# Altium footprint library ACTION_IC.PcbLib: 137 footprints (part 8 of 9)
Each footprint in its own frame and in the unit in brackets; x right, y up, seen from the top. Pads: shape width x height; smd on the part's side, far side on the other; paste and mask are expansions set on the pad; w line width, h text height; cw(c..) or ccw(c..) is an arc to the next point about the centre after c.
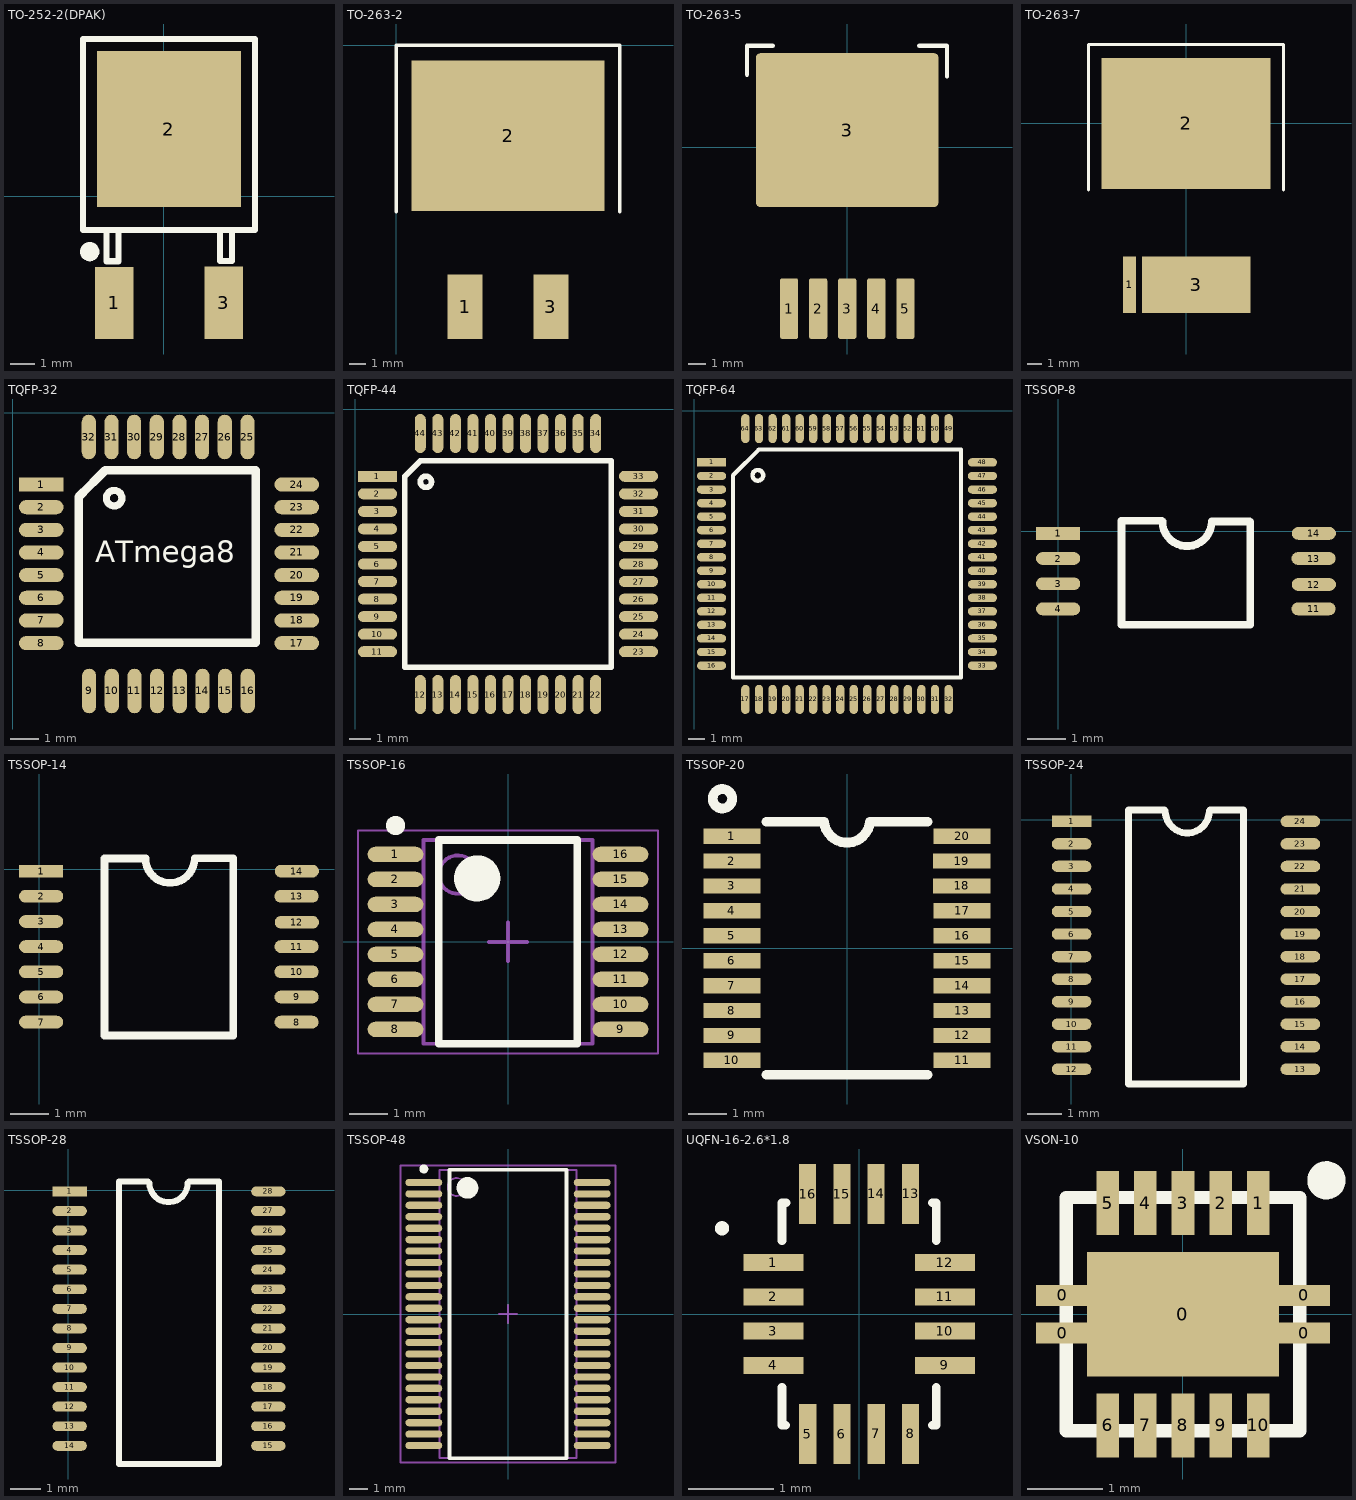
[diagram p7: the footprints below, top view; thin cyan lines are the x and y axes]

## TO-252-2(DPAK) [mil]
pads (3):
  rect 63x118.1 smd: 1(-81.63,-174.95)
  rect 236.2x255.9 smd: 2(8.33,109.85)
  rect 63x118.2 smd: 3(98.29,-174.7)
Top Overlay:
  lines w10: -94.03,-55.46 -94.03,-106.64 -74.35,-106.64 -74.35,-55.46 ; 91.89,-55.3 91.89,-106.48 111.58,-106.48 111.58,-55.3 ; -132.34,-55.46 -132.34,257.53 149,257.53 149,-55.46 -132.34,-55.46
  lines w15.75: -113.67,-91 cw(c-121.54,-90.95) -113.67,-90.9
3D body "TO-252.STEP": height 96.16, standoff 1.08, extent -121.74,-180.77 135.74,210.5

## TO-263-2 [mil]
pads (3):
  rect 82x150 smd: 1(160,-608) 3(360,-608)
  rect 450x350 smd: 2(260,-210)
Top Overlay:
  lines w8: 0,-387 0,0 520,0 520,-387.01
3D body "SW3dPS-DPAK.STEP": height 193.9, standoff -3.66, extent 61,-655.71 461,-54.78

## TO-263-5 [mil]
pads (6):
  rrect25% 42x140 smd: 1(-134,-372) 2(-67,-372) 3(0,-372) 4(67,-372) 5(134,-372)
  rrect5% 420x354.33 smd: 3(0,39.37)
Top Overlay:
  lines w10: -231,167 -231,234 -172,234 ; 166,234 229,234 ; 230,163 230,233
3D body "TO263-5.STEP": height 196.17, standoff 7.19, extent -196.85,-424.47 196.85,192.46

## TO-263-7 [mm]
pads (3):
  rect 0.9x3.81 smd: 1(-3.825,-10.922)
  rect 11.43x8.89 smd: 2(0,0)
  rect 7.35x3.81 smd: 3(0.695,-10.922)
Top Overlay:
  lines w0.203: -6.604,-4.496 -6.604,5.334 6.604,5.334 6.604,-4.496
3D body "User Library-TO263-7S.STEP": height 4.93, standoff 0.13, extent -4.975,-11.95 5.025,3.721

## TQFP-32 [mil]
pads (32):
  rect 62x19.68 smd: 1(40,-100)
  oval 62x19.68 smd: 2(40,-131.5) 3(40,-162.99) 4(40,-194.49) 5(40,-225.98) 6(40,-257.48) 7(40,-288.98) 8(40,-320.47) 17(395,-320.47) 18(395,-288.98) 19(395,-257.48) 20(395,-225.98) 21(395,-194.49) 22(395,-162.99) 23(395,-131.5) 24(395,-100)
  oval 19.68x62 smd: 9(106.51,-387) 10(138.01,-387) 11(169.5,-387) 12(201,-387) 13(232.5,-387) 14(263.99,-387) 15(295.49,-387) 16(326.98,-387) 25(326.52,-33.95) 26(295.02,-33.95) 27(263.53,-33.95) 28(232.03,-33.95) 29(200.53,-33.95) 30(169.04,-33.95) 31(137.54,-33.95) 32(106.05,-33.95)
Top Overlay:
  circle w10: c141.23,-119 r10.77
  lines w12: 93,-116 129,-80 338,-80 338,-320 92,-320 92,-117 98.99,-110.01
  text "ATmega8" at 115,-208 h30
3D body "IC_Microchip_ATMEGA328PB-AN_eec.STEP": height 10, standoff 0, extent 14,-412.18 418.36,-7.82

## TQFP-44 [mil]
pads (44):
  rect 70x19.68 smd: 1(40,-120)
  oval 70x19.68 smd: 2(40,-151.5) 3(40,-182.99) 4(40,-214.49) 5(40,-245.98) 6(40,-277.48) 7(40,-308.98) 8(40,-340.47) 9(40,-371.97) 10(40,-403.46) 11(40,-434.96) 23(508.5,-434.96) 24(508.5,-403.46) 25(508.5,-371.97) 26(508.5,-340.47) 27(508.5,-308.98) 28(508.5,-277.48) 29(508.5,-245.98) 30(508.5,-214.49) 31(508.5,-182.99) 32(508.5,-151.5) 33(508.5,-120)
  oval 19.68x70 smd: 12(116.77,-511.73) 13(148.27,-511.73) 14(179.76,-511.73) 15(211.26,-511.73) 16(242.76,-511.73) 17(274.25,-511.73) 18(305.75,-511.73) 19(337.24,-511.73) 20(368.74,-511.73) 21(400.24,-511.73) 22(431.73,-511.73) 34(431.73,-43.23) 35(400.24,-43.23) 36(368.74,-43.23) 37(337.24,-43.23) 38(305.75,-43.23) 39(274.25,-43.23) 40(242.76,-43.23) 41(211.26,-43.23) 42(179.76,-43.23) 43(148.27,-43.23) 44(116.77,-43.23)
Top Overlay:
  circle w10: c126.95,-130 r10.05
  lines w9.84: 89.21,-462.52 459.29,-462.52 459.29,-92.44
  lines w10: 89.21,-462.52 89.21,-120 116.77,-92.44 459.29,-92.44
3D body "TQFP-44.STEP": height 42.69, standoff -1.02, extent 39.79,-515.21 512.23,-42.77

## TQFP-64 [mm]
pads (64):
  rect 1.724x0.5 smd: 1(1.016,-3.044)
  oval 1.724x0.5 smd: 2(1.016,-3.844) 3(1.016,-4.644) 4(1.016,-5.444) 5(1.016,-6.244) 6(1.016,-7.044) 7(1.016,-7.844) 8(1.016,-8.644) 9(1.016,-9.444) 10(1.016,-10.244) 11(1.016,-11.044) 12(1.016,-11.844) 13(1.016,-12.644) 14(1.016,-13.444) 15(1.016,-14.244) 16(1.016,-15.044) 33(17.016,-15.044) 34(17.016,-14.244) 35(17.016,-13.444) 36(17.016,-12.644) 37(17.016,-11.844) 38(17.016,-11.044) 39(17.016,-10.244) 40(17.016,-9.444) 41(17.016,-8.644) 42(17.016,-7.844) 43(17.016,-7.044) 44(17.016,-6.244) 45(17.016,-5.444) 46(17.016,-4.644) 47(17.016,-3.844) 48(17.016,-3.044)
  oval 0.5x1.724 smd: 17(3.016,-17.044) 18(3.816,-17.044) 19(4.616,-17.044) 20(5.416,-17.044) 21(6.216,-17.044) 22(7.016,-17.044) 23(7.816,-17.044) 24(8.616,-17.044) 25(9.416,-17.044) 26(10.216,-17.044) 27(11.016,-17.044) 28(11.816,-17.044) 29(12.616,-17.044) 30(13.416,-17.044) 31(14.216,-17.044) 32(15.016,-17.044) 49(15.016,-1.044) 50(14.216,-1.044) 51(13.416,-1.044) 52(12.616,-1.044) 53(11.816,-1.044) 54(11.016,-1.044) 55(10.216,-1.044) 56(9.416,-1.044) 57(8.616,-1.044) 58(7.816,-1.044) 59(7.016,-1.044) 60(6.216,-1.044) 61(5.416,-1.044) 62(4.616,-1.044) 63(3.816,-1.044) 64(3.016,-1.044)
Top Overlay:
  circle w0.254: c3.748,-3.806 r0.316
  lines w0.254: 2.286,-15.744 2.286,-3.806 3.81,-2.282 15.748,-2.282 15.748,-15.744 2.286,-15.744
3D body "User Library-TQFP64-1.STEP": height 1.36, standoff 0, extent 0.893,-17.12 17.141,-0.871

## TSSOP-8 [mil]
pads (8):
  rect 45x12.99 smd: 1(-0.16,-2)
  oval 45x12.99 smd: 2(-0.16,-27.59) 3(-0.16,-53.18) 4(-0.16,-78.77) 11(259.69,-78.77) 12(260,-54) 13(259.69,-27.59) 14(260,-2)
Top Overlay:
  lines w7.87: 105.2,10.79 64.21,10.79 64.21,-94.88 195.31,-94.88 195.31,9.84 ; 106,10 ccw(c131,10) 156,10 194.52,10
3D body "TSS0P-8.STEP": height 43, standoff 0, extent 7.38,-99 254.62,19.11

## TSSOP-14 [mil]
pads (14):
  rect 45x12.99 smd: 1(1.84,-2)
  oval 45x12.99 smd: 2(1.84,-27.59) 3(1.84,-53.18) 4(1.84,-78.77) 5(1.84,-104.36) 6(1.84,-129.95) 7(1.84,-155.54) 8(261.69,-155.54) 9(261.69,-129.95) 10(261.69,-104.36) 11(261.69,-78.77) 12(262,-54) 13(261.69,-27.59) 14(262,-2)
Top Overlay:
  lines w7.87: 107.64,10.79 66.21,10.79 66.21,-169.29 197.31,-169.29 197.31,10.79 ; 108,11 ccw(c133,11) 158,11 197.11,11
3D body "User Library-TSSOP-14.STEP": height 47.24, standoff 0, extent 7.03,-177.43 258.99,19.43

## TSSOP-16 [mm]
height 1.1
pads (16):
  oval 1.45x0.4 smd: 1(-2.925,2.275) 2(-2.925,1.625) 3(-2.925,0.975) 4(-2.925,0.325) 5(-2.925,-0.325) 6(-2.925,-0.975) 7(-2.925,-1.625) 8(-2.925,-2.275) 9(2.925,-2.275) 10(2.925,-1.625) 11(2.925,-0.975) 12(2.925,-0.325) 13(2.925,0.325) 14(2.925,0.975) 15(2.925,1.625) 16(2.925,2.275)
Top Overlay:
  circle w0.6: c-0.8,1.65 r0.3
  circle w0.25: c-2.925,3.025 r0.125
  lines w0.2: -1.8,-2.65 1.8,-2.65 1.8,2.65 -1.8,2.65 -1.8,-2.65
Mechanical 13:
  circle w0.1: c-1.3,1.75 r0.5
  lines w0.1: -2.2,-2.65 2.2,-2.65 2.2,2.65 -2.2,2.65 -2.2,-2.65
Mechanical 15:
  lines w0.05: -3.9,-2.9 3.9,-2.9 3.9,2.9 -3.9,2.9 -3.9,-2.9
  lines w0.1: -0.5,0 0.5,0 ; 0,-0.5 0,0.5
3D body "TSSOP-16.step": height 1.1, standoff 0, extent -3.2,-2.65 3.2,2.65

## TSSOP-20 [mm]
pads (20):
  rect 1.494x0.4 smd: 1(-3.001,2.925) 2(-3.001,2.275) 3(-3.001,1.625) 4(-3.001,0.975) 5(-3.001,0.325) 6(-3.001,-0.324) 7(-3.001,-0.975) 8(-3.001,-1.625) 9(-3.001,-2.275) 10(-3.001,-2.925) 11(3.001,-2.925) 12(3.001,-2.275) 13(3.001,-1.625) 14(3.001,-0.975) 15(3.001,-0.325) 16(3.001,0.325) 17(3.001,0.975) 18(2.996,1.625) 19(2.996,2.275) 20(3.001,2.925)
Top Overlay:
  circle w0.254: c-3.25,3.9 r0.254
  lines w0.254: -2.105,-3.3 -2.105,-3.3 2.105,-3.3 ; -2.105,3.3 -2.105,3.3 -0.6,3.3 ccw(c0,3.357) 0.6,3.3 2.105,3.3
3D body "User Library-TSSOP20_TP.STEP": height 1.1, standoff -0.09, extent -3.165,-3.35 3.115,3.15

## TSSOP-24 [mm]
pads (24):
  rect 1.143x0.33 smd: 1(0.016,-0.046)
  oval 1.143x0.33 smd: 2(0.016,-0.696) 3(0.016,-1.346) 4(0.016,-1.996) 5(0.016,-2.646) 6(0.016,-3.296) 7(0.016,-3.946) 8(0.016,-4.596) 9(0.016,-5.246) 10(0.016,-5.896) 11(0.016,-6.546) 12(0.016,-7.196) 13(6.616,-7.196) 14(6.616,-6.546) 15(6.616,-5.896) 16(6.616,-5.246) 17(6.616,-4.596) 18(6.616,-3.946) 19(6.616,-3.296) 20(6.616,-2.646) 21(6.616,-1.996) 22(6.616,-1.346) 23(6.616,-0.696) 24(6.616,-0.046)
Top Overlay:
  lines w0.2: 2.692,0.279 1.651,0.279 1.651,-7.62 4.981,-7.62 4.981,0.279 4.013,0.279 ; 2.718,0.254 ccw(c3.353,0.254) 3.988,0.254
3D body "User Library-SOT340-1.STEP": height 1.89, standoff -0.01, extent -0.473,-7.774 7.077,0.459

## TSSOP-28 [mm]
pads (28):
  rect 1.143x0.33 smd: 1(0.041,-0.046)
  oval 1.143x0.33 smd: 2(0.041,-0.696) 3(0.041,-1.346) 4(0.041,-1.996) 5(0.041,-2.646) 6(0.041,-3.296) 7(0.041,-3.946) 8(0.041,-4.596) 9(0.041,-5.246) 10(0.041,-5.896) 11(0.041,-6.546) 12(0.041,-7.196) 13(0.041,-7.846) 14(0.041,-8.496) 15(6.641,-8.496) 16(6.641,-7.846) 17(6.641,-7.196) 18(6.641,-6.546) 19(6.641,-5.896) 20(6.641,-5.246) 21(6.641,-4.596) 22(6.641,-3.946) 23(6.641,-3.296) 24(6.641,-2.646) 25(6.641,-1.996) 26(6.641,-1.346) 27(6.641,-0.696) 28(6.641,-0.046)
Top Overlay:
  lines w0.2: 2.642,0.279 1.676,0.279 1.676,-9.1 5.006,-9.1 5.006,0.279 4.013,0.279 ; 2.692,0.229 ccw(c3.327,0.229) 3.962,0.229
3D body "TSSOP-28.STEP": height 0.95, standoff -0.03, extent 0.178,-9.117 6.578,0.583

## TSSOP-48 [mm]
height 2.79
pads (48):
  oval 2.05x0.4 smd: 1(-4.675,7.302) 2(-4.675,6.667) 3(-4.675,6.032) 4(-4.675,5.397) 5(-4.675,4.763) 6(-4.675,4.127) 7(-4.675,3.492) 8(-4.675,2.857) 9(-4.675,2.222) 10(-4.675,1.587) 11(-4.675,0.953) 12(-4.675,0.318) 13(-4.675,-0.318) 14(-4.675,-0.953) 15(-4.675,-1.587) 16(-4.675,-2.222) 17(-4.675,-2.857) 18(-4.675,-3.492) 19(-4.675,-4.127) 20(-4.675,-4.763) 21(-4.675,-5.397) 22(-4.675,-6.032) 23(-4.675,-6.667) 24(-4.675,-7.302) 25(4.675,-7.302) 26(4.675,-6.667) 27(4.675,-6.032) 28(4.675,-5.397) 29(4.675,-4.763) 30(4.675,-4.127) 31(4.675,-3.492) 32(4.675,-2.857) 33(4.675,-2.222) 34(4.675,-1.587) 35(4.675,-0.953) 36(4.675,-0.318) 37(4.675,0.318) 38(4.675,0.953) 39(4.675,1.587) 40(4.675,2.222) 41(4.675,2.857) 42(4.675,3.492) 43(4.675,4.127) 44(4.675,4.763) 45(4.675,5.397) 46(4.675,6.032) 47(4.675,6.667) 48(4.675,7.302)
Top Overlay:
  circle w0.6: c-2.25,7 r0.3
  circle w0.25: c-4.675,8.053 r0.125
  lines w0.2: -3.25,-8 3.25,-8 3.25,8 -3.25,8 -3.25,-8
Mechanical 13:
  circle w0.1: c-2.845,7.05 r0.5
  lines w0.1: -3.795,-8 3.795,-8 3.795,8 -3.795,8 -3.795,-8
Mechanical 15:
  lines w0.1: -0.5,0 0.5,0 ; 0,-0.5 0,0.5 ; -5.975,-8.25 5.975,-8.25 5.975,8.25 -5.975,8.25 -5.975,-8.25
3D body: height 2.79, standoff 0.1, extent -3.795,-8 3.795,8

## UQFN-16-2.6*1.8 [mm]
pads (16):
  rect 0.7x0.198 smd: 1(-1,0.601)
  rect 0.7x0.2 smd: 2(-1,0.2) 9(1,-0.6) 10(1,-0.2)
  rect 0.7x0.199 smd: 3(-1,-0.199) 12(1,0.6)
  rect 0.7x0.201 smd: 4(-1,-0.601) 11(1,0.2)
  rect 0.2x0.7 smd: 5(-0.6,-1.401) 6(-0.2,-1.401) 8(0.601,-1.4) 13(0.6,1.401) 15(-0.2,1.398)
  rect 0.201x0.7 smd: 7(0.2,-1.4)
  rect 0.198x0.7 smd: 14(0.2,1.401) 16(-0.6,1.398)
Top Overlay:
  circle w0.102: c-1.6,1 r0.032
  lines w0.102: -0.9,-0.856 -0.9,-1.3 -0.855,-1.3 ; -0.9,0.855 -0.9,1.3 -0.854,1.3 ; 0.855,1.3 0.9,1.3 0.9,0.855 ; 0.855,-1.3 0.9,-1.3 0.9,-0.855

## VSON-10 [mm]
pads (15):
  rect 0.7x0.28 smd mask+0.07: 0(-1.602,-0.25) 0(-1.602,0.25) 0(1.602,-0.25) 0(1.602,0.25)
  rect 2.55x1.65 smd: 0(0,0)
  rect 0.3x0.85 smd mask+0.07: 1(1,1.475) 2(0.5,1.475) 3(0,1.475) 4(-0.5,1.475) 5(-1,1.475) 6(-1,-1.475) 7(-0.5,-1.475) 8(0,-1.475) 9(0.5,-1.475) 10(1,-1.475)
Top Overlay:
  circle w0.254: c1.905,1.778 r0.127
  lines w0.178: -1.55,-1.55 1.55,-1.55 1.55,1.55 -1.55,1.55 -1.55,-1.55
3D body "User Library-PVSON-10-1.step": height 0.9, standoff 0, extent -1.501,-1.501 1.501,1.501